# Altium footprint library Connector_art.PcbLib: 209 footprints (part 5 of 14)
Each footprint in its own frame and in the unit in brackets; x right, y up, seen from the top. Pads: shape width x height; smd on the part's side, far side on the other; paste and mask are expansions set on the pad; w line width, h text height; cw(c..) or ccw(c..) is an arc to the next point about the centre after c.
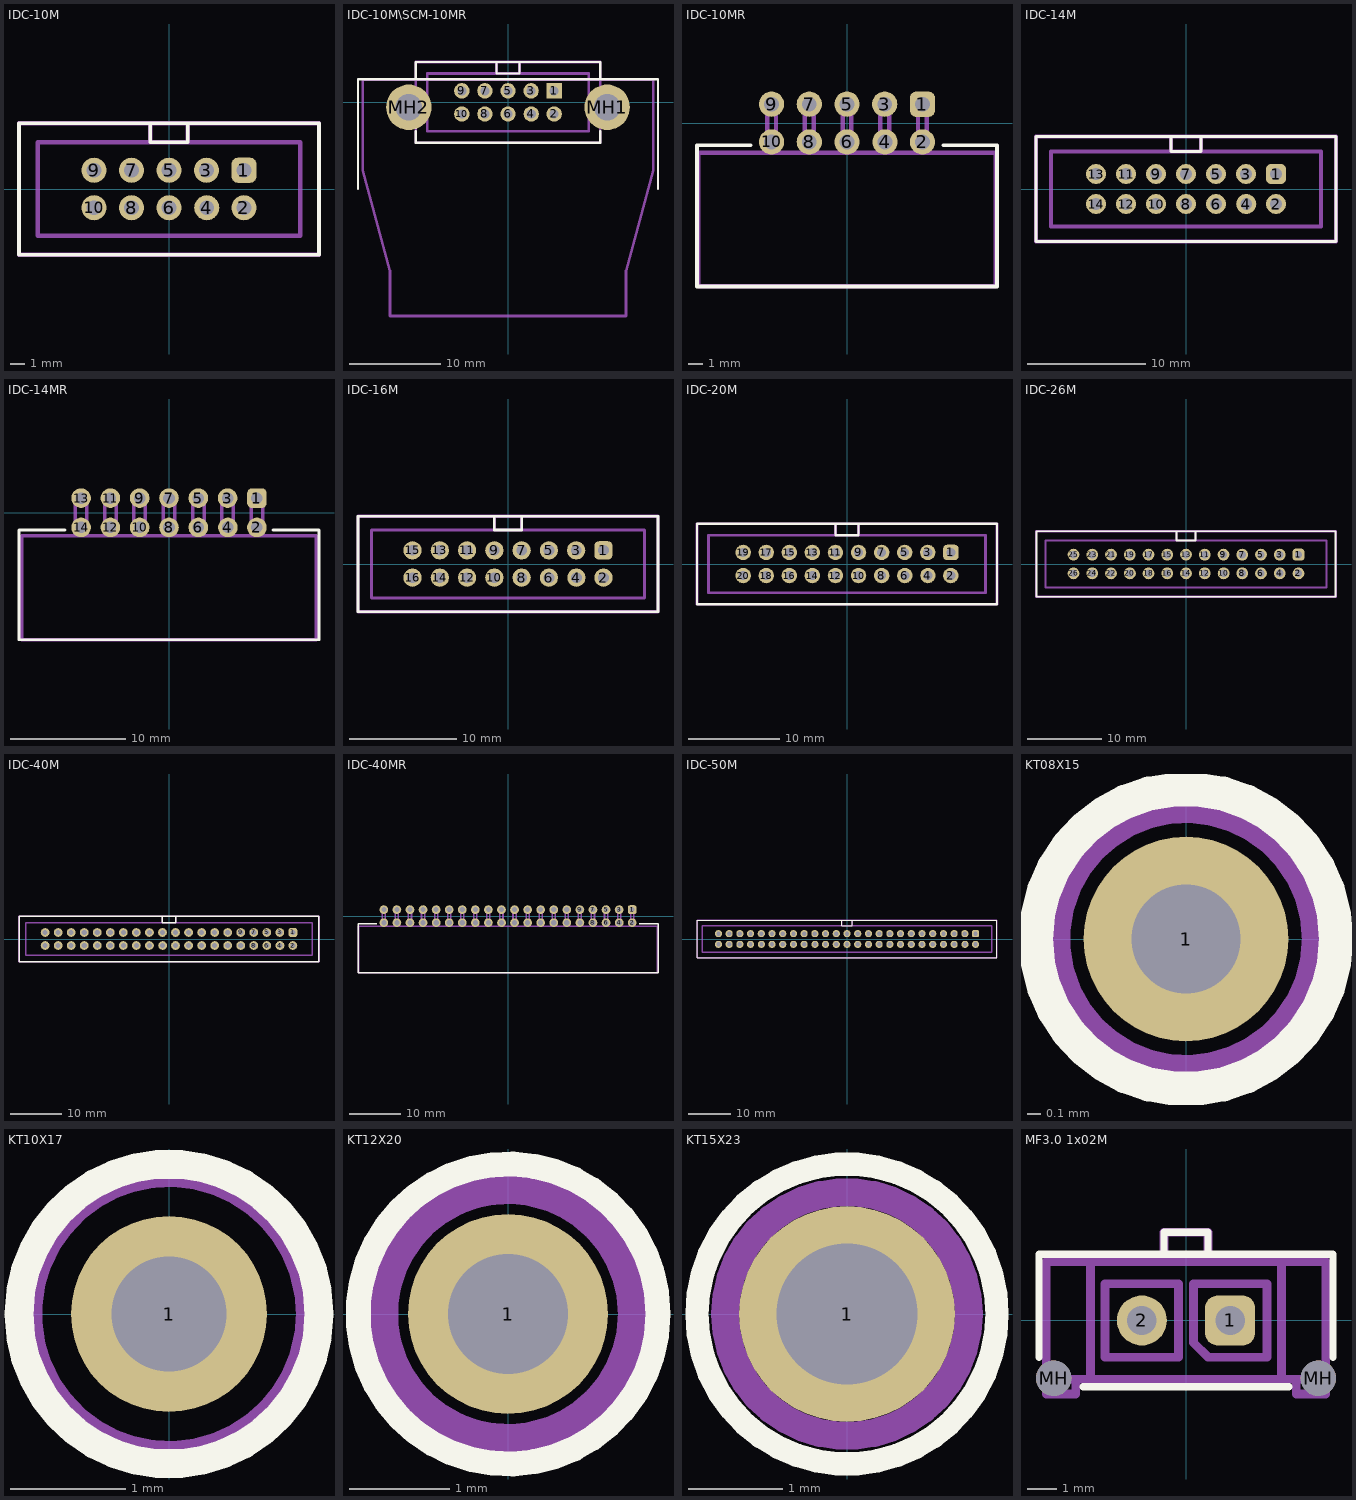
[diagram p4: the footprints below, top view; thin cyan lines are the x and y axes]

## IDC-10M [mm]
height 9
pads (10):
  rrect50% 1.7x1.7 hole 1: 1(5.08,1.27)
  round 1.7 hole 1: 2(5.08,-1.27) 3(2.54,1.27) 4(2.56,-1.27) 5(0,1.27) 6(0,-1.27) 7(-2.54,1.27) 8(-2.54,-1.27) 9(-5.08,1.27) 10(-5.08,-1.27)
Top Overlay:
  lines w0.25: -1.27,4.445 -1.27,3.175 1.27,3.175 1.27,4.445 ; -10.16,-4.445 10.16,-4.445 10.16,4.445 -10.16,4.445 -10.16,-4.445
Mechanical 1:
  lines w0.3: -1.27,3.175 -1.27,4.445 ; 1.27,3.175 1.27,4.445 ; -10.16,-4.445 10.16,-4.445 10.16,4.445 -10.16,4.445 -10.16,-4.445 ; -8.89,-3.175 -8.89,3.175 8.89,3.175 8.89,-3.175 -8.89,-3.175
3D body: height 9.45, standoff -3.2, extent -10.16,-4.75 10.16,4.45

## IDC-10M\SCM-10MR [mm]
height 8.5
pads (12):
  rect 1.7x1.7 hole 1: 1(5.08,1.27)
  round 1.7 hole 1: 2(5.08,-1.27) 3(2.54,1.27) 4(2.56,-1.27) 5(0,1.27) 6(0,-1.27) 7(-2.54,1.27) 8(-2.54,-1.27) 9(-5.08,1.27) 10(-5.08,-1.27)
  round 5 hole 2.9: MH1(10.92,-0.53) MH2(-10.92,-0.53)
Top Overlay:
  lines w0.25: -16.51,-9.525 -16.51,2.54 16.51,2.54 16.51,-9.525 ; -10.16,-3.175 -10.16,-4.445 10.16,-4.445 10.16,-3.175 ; -10.16,-2.778 -10.16,-2.222 -9,-1.062 ; -10.16,2.54 -10.16,4.445 10.16,4.445 10.16,2.54 ; -1.27,4.445 -1.27,3.175 1.27,3.175 1.27,4.445
Mechanical 1:
  lines w0.3: -1.27,3.175 -1.27,4.445 ; 1.27,3.175 1.27,4.445 ; -16,-7.5 -16,2.5 16,2.5 16,-7.5 13,-18.5 13,-23.5 -13,-23.5 -13,-18.5 -16,-7.5 ; -10.16,-4.445 10.16,-4.445 10.16,4.445 -10.16,4.445 -10.16,-4.445 ; -8.89,-3.175 -8.89,3.175 8.89,3.175 8.89,-3.175 -8.89,-3.175
3D body: height 9.45, standoff -3.2, extent -10.16,-4.75 10.16,4.45

## IDC-10MR [mm]
height 9.2
pads (10):
  rrect50% 1.7x1.7 hole 1: 1(5.08,1.27)
  round 1.7 hole 1: 2(5.08,-1.27) 3(2.54,1.27) 4(2.56,-1.27) 5(0,1.27) 6(0,-1.27) 7(-2.54,1.27) 8(-2.54,-1.27) 9(-5.08,1.27) 10(-5.08,-1.27)
Top Overlay:
  lines w0.25: -6.5,-1.5 -10.1,-1.5 -10.1,-11 10.1,-11 10.1,-1.5 6.5,-1.5
Mechanical 1:
  lines w0.3: -5.38,-2 -5.38,1.27 -4.78,1.27 -4.78,-2 ; -2.84,-2 -2.84,1.27 -2.24,1.27 -2.24,-2 ; -0.3,-2 -0.3,1.27 0.3,1.27 0.3,-2 ; 2.24,-2 2.24,1.27 2.84,1.27 2.84,-2 ; 4.78,-2 4.78,1.27 5.38,1.27 5.38,-2 ; -10,-11 -10,-2 10,-2 10,-11 -10,-11
3D body: height 9.2, standoff -3.2, extent -10.16,-10.93 10.16,1.59

## IDC-14M [mm]
height 9
pads (14):
  rrect50% 1.7x1.7 hole 1: 1(7.62,1.27)
  round 1.7 hole 1: 2(7.62,-1.27) 3(5.08,1.27) 4(5.1,-1.27) 5(2.54,1.27) 6(2.54,-1.27) 7(0,1.27) 8(0,-1.27) 9(-2.54,1.27) 10(-2.54,-1.27) 11(-5.08,1.27) 12(-5.08,-1.27) 13(-7.62,1.27) 14(-7.62,-1.27)
Top Overlay:
  lines w0.25: -1.27,4.445 -1.27,3.175 1.27,3.175 1.27,4.445 ; -12.7,-4.445 12.7,-4.445 12.7,4.445 -12.7,4.445 -12.7,-4.445
Mechanical 1:
  lines w0.3: -1.27,3.175 -1.27,4.445 ; 1.27,3.175 1.27,4.445 ; -12.7,-4.445 12.7,-4.445 12.7,4.445 -12.7,4.445 -12.7,-4.445 ; -11.43,-3.175 -11.43,3.175 11.43,3.175 11.43,-3.175 -11.43,-3.175
3D body: height 9.45, standoff -3.2, extent -12.7,-4.75 12.7,4.45

## IDC-14MR [mm]
height 9.2
pads (14):
  rrect50% 1.7x1.7 hole 1: 1(7.62,1.27)
  round 1.7 hole 1: 2(7.62,-1.27) 3(5.08,1.27) 4(5.1,-1.27) 5(2.54,1.27) 6(2.54,-1.27) 7(0,1.27) 8(0,-1.27) 9(-2.54,1.27) 10(-2.54,-1.27) 11(-5.08,1.27) 12(-5.08,-1.27) 13(-7.62,1.27) 14(-7.62,-1.27)
Top Overlay:
  lines w0.25: -9,-1.5 -13,-1.5 -13,-11 13,-11 13,-1.5 9,-1.5
Mechanical 1:
  lines w0.3: -8.12,-2 -8.12,1.25 -7.12,1.25 -7.12,-2 ; -5.58,-2 -5.58,1.25 -4.58,1.25 -4.58,-2 ; -3.04,-2 -3.04,1.25 -2.04,1.25 -2.04,-2 ; -0.5,-2 -0.5,1.25 0.5,1.25 0.5,-2 ; 2.04,-2 2.04,1.25 3.04,1.25 3.04,-2 ; 4.58,-2 4.58,1.25 5.58,1.25 5.58,-2 ; 7.12,-2 7.12,1.25 8.12,1.25 8.12,-2 ; -12.75,-11 -12.75,-2 12.75,-2 12.75,-11 -12.75,-11
3D body: height 9.2, standoff -3.2, extent -12.7,-10.93 12.7,1.59

## IDC-16M [mm]
height 9
pads (16):
  rrect50% 1.7x1.7 hole 1: 1(8.89,1.27)
  round 1.7 hole 1: 2(8.89,-1.27) 3(6.35,1.27) 4(6.37,-1.27) 5(3.81,1.27) 6(3.81,-1.27) 7(1.27,1.27) 8(1.27,-1.27) 9(-1.27,1.27) 10(-1.27,-1.27) 11(-3.81,1.27) 12(-3.81,-1.27) 13(-6.35,1.27) 14(-6.35,-1.27) 15(-8.89,1.27) 16(-8.89,-1.27)
Top Overlay:
  lines w0.25: -1.27,4.445 -1.27,3.175 1.27,3.175 1.27,4.445 ; -13.97,-4.445 -13.97,4.445 13.97,4.445 13.97,-4.445 -13.97,-4.445
Mechanical 1:
  lines w0.3: -1.27,3.175 -1.27,4.445 ; 1.27,3.175 1.27,4.445 ; -13.97,-4.445 -13.97,4.445 13.97,4.445 13.97,-4.445 -13.97,-4.445 ; -12.7,-3.175 12.7,-3.175 12.7,3.175 -12.7,3.175 -12.7,-3.175
3D body: height 9.45, standoff -3.2, extent -13.97,-4.75 13.97,4.45

## IDC-20M [mm]
height 9
pads (20):
  rrect50% 1.7x1.7 hole 1: 1(11.43,1.27)
  round 1.7 hole 1: 2(11.43,-1.27) 3(8.89,1.27) 4(8.91,-1.27) 5(6.35,1.27) 6(6.37,-1.27) 7(3.81,1.27) 8(3.81,-1.27) 9(1.27,1.27) 10(1.27,-1.27) 11(-1.27,1.27) 12(-1.27,-1.27) 13(-3.81,1.27) 14(-3.81,-1.27) 15(-6.35,1.27) 16(-6.35,-1.27) 17(-8.89,1.27) 18(-8.89,-1.27) 19(-11.43,1.27) 20(-11.43,-1.27)
Top Overlay:
  lines w0.25: -1.27,4.445 -1.27,3.175 1.27,3.175 1.27,4.445 ; -16.51,-4.445 -16.51,4.445 16.51,4.445 16.51,-4.445 -16.51,-4.445
Mechanical 1:
  lines w0.3: -1.27,3.175 -1.27,4.445 ; 1.27,3.175 1.27,4.445 ; -16.51,-4.445 -16.51,4.445 16.51,4.445 16.51,-4.445 -16.51,-4.445 ; -15.24,-3.175 15.24,-3.175 15.24,3.175 -15.24,3.175 -15.24,-3.175
3D body: height 9, standoff -3, extent -16.54,-4.5 16.54,4.5

## IDC-26M [mm]
height 9
pads (26):
  rrect50% 1.6x1.6 hole 1: 1(15.24,1.27)
  round 1.6 hole 1: 2(15.24,-1.27) 3(12.7,1.27) 4(12.7,-1.27) 5(10.16,1.27) 6(10.16,-1.27) 7(7.62,1.27) 8(7.62,-1.27) 9(5.08,1.27) 10(5.1,-1.27) 11(2.54,1.27) 12(2.54,-1.27) 13(0,1.27) 14(0,-1.27) 15(-2.54,1.27) 16(-2.54,-1.27) 17(-5.08,1.27) 18(-5.08,-1.27) 19(-7.62,1.27) 20(-7.6,-1.27) 21(-10.16,1.27) 22(-10.16,-1.27) 23(-12.7,1.27) 24(-12.7,-1.27) 25(-15.24,1.27) 26(-15.24,-1.27)
Top Overlay:
  lines w0.25: -1.27,4.445 -1.27,3.175 1.27,3.175 1.27,4.445 ; -20.26,-4.445 20.26,-4.445 20.26,4.445 -20.26,4.445 -20.26,-4.445
Mechanical 1:
  lines w0.3: -1.27,3.175 -1.27,4.445 ; 1.27,3.175 1.27,4.445 ; -20.32,-4.445 20.32,-4.445 20.32,4.445 -20.32,4.445 -20.32,-4.445 ; -19.05,-3.175 -19.05,3.175 19.05,3.175 19.05,-3.175 -19.05,-3.175
3D body: height 9, standoff -3, extent -20.46,-4.5 20.46,4.5

## IDC-40M [mm]
height 9
pads (40):
  rrect50% 1.7x1.7 hole 1: 1(24.13,1.27)
  round 1.7 hole 1: 2(24.13,-1.27) 3(21.59,1.27) 4(21.61,-1.27) 5(19.05,1.27) 6(19.05,-1.27) 7(16.51,1.27) 8(16.51,-1.27) 9(13.97,1.27) 10(13.97,-1.27) 11(11.43,1.27) 12(11.43,-1.27) 13(8.89,1.27) 14(8.89,-1.27) 15(6.35,1.27) 16(6.35,-1.27) 17(3.81,1.27) 18(3.81,-1.27) 19(1.27,1.27) 20(1.27,-1.27) 21(-1.27,1.27) 22(-1.25,-1.27) 23(-3.81,1.27) 24(-3.81,-1.27) 25(-6.35,1.27) 26(-6.35,-1.27) 27(-8.89,1.27) 28(-8.89,-1.27) 29(-11.43,1.27) 30(-11.43,-1.27) 31(-13.97,1.27) 32(-13.95,-1.27) 33(-16.51,1.27) 34(-16.51,-1.27) 35(-19.05,1.27) 36(-19.05,-1.27) 37(-21.59,1.27) 38(-21.59,-1.27) 39(-24.13,1.27) 40(-24.13,-1.27)
Top Overlay:
  lines w0.25: -1.27,4.445 -1.27,3.175 1.27,3.175 1.27,4.445 ; -29.15,-4.445 29.15,-4.445 29.15,4.445 -29.15,4.445 -29.15,-4.445
Mechanical 1:
  lines w0.3: -1.27,3.175 -1.27,4.445 ; 1.27,3.175 1.27,4.445 ; -29.21,-4.445 29.21,-4.445 29.21,4.445 -29.21,4.445 -29.21,-4.445 ; -27.94,-3.175 27.94,-3.175 27.94,3.175 -27.94,3.175 -27.94,-3.175
3D body: height 9, standoff -3, extent -29,-4.5 29,4.5

## IDC-40MR [mm]
height 9
pads (40):
  rrect50% 1.7x1.7 hole 1: 1(24.13,1.27)
  round 1.7 hole 1: 2(24.13,-1.27) 3(21.59,1.27) 4(21.61,-1.27) 5(19.05,1.27) 6(19.05,-1.27) 7(16.51,1.27) 8(16.51,-1.27) 9(13.97,1.27) 10(13.97,-1.27) 11(11.43,1.27) 12(11.43,-1.27) 13(8.89,1.27) 14(8.89,-1.27) 15(6.35,1.27) 16(6.35,-1.27) 17(3.81,1.27) 18(3.81,-1.27) 19(1.27,1.27) 20(1.27,-1.27) 21(-1.27,1.27) 22(-1.25,-1.27) 23(-3.81,1.27) 24(-3.81,-1.27) 25(-6.35,1.27) 26(-6.35,-1.27) 27(-8.89,1.27) 28(-8.89,-1.27) 29(-11.43,1.27) 30(-11.43,-1.27) 31(-13.97,1.27) 32(-13.95,-1.27) 33(-16.51,1.27) 34(-16.51,-1.27) 35(-19.05,1.27) 36(-19.05,-1.27) 37(-21.59,1.27) 38(-21.59,-1.27) 39(-24.13,1.27) 40(-24.13,-1.27)
Top Overlay:
  lines w0.25: -25.55,-1.5 -29.15,-1.5 -29.15,-11 29.15,-11 29.15,-1.5 25.55,-1.5
Mechanical 1:
  lines w0.3: -24.43,-2 -24.43,1.27 -23.83,1.27 -23.83,-2 ; -21.89,-2 -21.89,1.27 -21.29,1.27 -21.29,-2 ; -19.35,-2 -19.35,1.27 -18.75,1.27 -18.75,-2 ; -16.81,-2 -16.81,1.27 -16.21,1.27 -16.21,-2 ; -14.27,-2 -14.27,1.27 -13.67,1.27 -13.67,-2 ; -11.73,-2 -11.73,1.27 -11.13,1.27 -11.13,-2 ; -9.19,-2 -9.19,1.27 -8.59,1.27 -8.59,-2 ; -6.65,-2 -6.65,1.27 -6.05,1.27 -6.05,-2 ; -4.11,-2 -4.11,1.27 -3.51,1.27 -3.51,-2 ; -1.57,-2 -1.57,1.27 -0.97,1.27 -0.97,-2 ; 0.97,-2 0.97,1.27 1.57,1.27 1.57,-2 ; 3.51,-2 3.51,1.27 4.11,1.27 4.11,-2 ; 6.05,-2 6.05,1.27 6.65,1.27 6.65,-2 ; 8.59,-2 8.59,1.27 9.19,1.27 9.19,-2 ; 11.13,-2 11.13,1.27 11.73,1.27 11.73,-2 ; 13.67,-2 13.67,1.27 14.27,1.27 14.27,-2 ; 16.21,-2 16.21,1.27 16.81,1.27 16.81,-2 ; 18.75,-2 18.75,1.27 19.35,1.27 19.35,-2 ; 21.29,-2 21.29,1.27 21.89,1.27 21.89,-2 ; 23.83,-2 23.83,1.27 24.43,1.27 24.43,-2 ; -29.05,-11 29.05,-11 29.05,-2 -29.05,-2 -29.05,-11
3D body: height 9.14, standoff -3.43, extent -29.21,-10.87 29.21,1.583

## IDC-50M [mm]
height 9
pads (50):
  rrect50% 1.7x1.7 hole 1: 1(30.48,1.27)
  round 1.7 hole 1: 2(30.48,-1.27) 3(27.94,1.27) 4(27.96,-1.27) 5(25.4,1.27) 6(25.4,-1.27) 7(22.86,1.27) 8(22.86,-1.27) 9(20.32,1.27) 10(20.32,-1.27) 11(17.78,1.27) 12(17.78,-1.27) 13(15.24,1.27) 14(15.24,-1.27) 15(12.7,1.27) 16(12.7,-1.27) 17(10.16,1.27) 18(10.16,-1.27) 19(7.62,1.27) 20(7.62,-1.27) 21(5.08,1.27) 22(5.1,-1.27) 23(2.54,1.27) 24(2.54,-1.27) 25(0,1.27) 26(0,-1.27) 27(-2.54,1.27) 28(-2.54,-1.27) 29(-5.08,1.27) 30(-5.08,-1.27) 31(-7.62,1.27) 32(-7.6,-1.27) 33(-10.16,1.27) 34(-10.16,-1.27) 35(-12.7,1.27) 36(-12.7,-1.27) 37(-15.24,1.27) 38(-15.24,-1.27) 39(-17.78,1.27) 40(-17.78,-1.27) 41(-20.32,1.27) 42(-20.3,-1.27) 43(-22.86,1.27) 44(-22.86,-1.27) 45(-25.4,1.27) 46(-25.4,-1.27) 47(-27.94,1.27) 48(-27.94,-1.27) 49(-30.48,1.27) 50(-30.48,-1.27)
Top Overlay:
  lines w0.25: -1.27,4.445 -1.27,3.175 1.27,3.175 1.27,4.445 ; -35.5,-4.445 35.5,-4.445 35.5,4.445 -35.5,4.445 -35.5,-4.445
Mechanical 1:
  lines w0.3: -1.27,3.175 -1.27,4.445 ; 1.27,3.175 1.27,4.445 ; -35.56,-4.445 35.56,-4.445 35.56,4.445 -35.56,4.445 -35.56,-4.445 ; -34.29,-3.175 -34.29,3.175 34.29,3.175 34.29,-3.175 -34.29,-3.175
3D body: height 9.45, standoff -3.2, extent -35.66,-4.75 35.66,4.45

## KT08X15 [mm]
pads (1):
  round 1.5 hole 0.8: 1(0,0)
Top Overlay:
  circle w0.25: c0,0 r1.1
Bottom Overlay:
  circle w0.25: c0,0 r1.1
Mechanical 1:
  circle w0.3: c0,0 r1

## KT10X17 [mm]
pads (1):
  round 1.7 hole 1: 1(0,0)
Top Overlay:
  circle w0.25: c0,0 r1.3
Bottom Overlay:
  circle w0.25: c0,0 r1.3
Mechanical 1:
  circle w0.3: c0,0 r1.25

## KT12X20 [mm]
pads (1):
  round 2 hole 1.2: 1(0,0)
Top Overlay:
  circle w0.25: c0,0 r1.5
Bottom Overlay:
  circle w0.25: c0,0 r1.5
Mechanical 1:
  circle w0.3: c0,0 r1.25

## KT15X23 [mm]
pads (1):
  round 2.3 hole 1.5: 1(0,0)
Top Overlay:
  circle w0.25: c0,0 r1.6
Bottom Overlay:
  circle w0.25: c0,0 r1.6
Mechanical 1:
  circle w0.3: c0,0 r1.3

## MF3.0 1x02M [mm]
height 9.91
pads (4):
  rrect50% 1.7x1.7 hole 1 paste+0: 1(1.5,0)
  round 1.7 hole 1: 2(-1.5,0)
  round 1.2 hole 1.2 unplated: MH(-4.5,-1.96) MH(4.5,-1.96)
Top Overlay:
  lines w0.25: -5,-1.25 -5,2.25 5,2.25 5,-1.25 ; -3.5,-2.25 3.5,-2.25 ; -0.75,2.25 -0.75,3 0.75,3 0.75,2.25
Mechanical 1:
  lines w0.3: -3.75,-2 -3.75,-2.5 -4.75,-2.5 ; -0.75,2 -0.75,3 0.75,3 0.75,2 ; 3.75,-2 3.75,-2.5 4.75,-2.5 ; -4.75,-2.5 -4.75,2 -3.25,2 ; -4.75,-2.5 -4.75,-2 -3.25,-2 ; -3.25,-2 -3.25,2 ; -3.25,-2 3.25,-2 ; -3.25,2 3.25,2 ; 3.25,-2 3.25,2 ; 3.25,-2 4.75,-2 4.75,-2.5 ; 3.25,2 4.75,2 4.75,-2.5 ; -2.75,-1.25 -2.75,1.25 -0.25,1.25 -0.25,-1.25 -2.75,-1.25 ; 0.25,-0.75 0.75,-1.25 2.75,-1.25 2.75,1.25 0.25,1.25 0.25,-0.75
3D body: height 9.91, standoff -3.17, extent -4.825,-2.47 4.825,3.1